# Altium footprint library JEDEC_G.PcbLib: 194 footprints (part 3 of 13)
Each footprint in its own frame and in the unit in brackets; x right, y up, seen from the top. Pads: shape width x height; smd on the part's side, far side on the other; paste and mask are expansions set on the pad; w line width, h text height; cw(c..) or ccw(c..) is an arc to the next point about the centre after c.
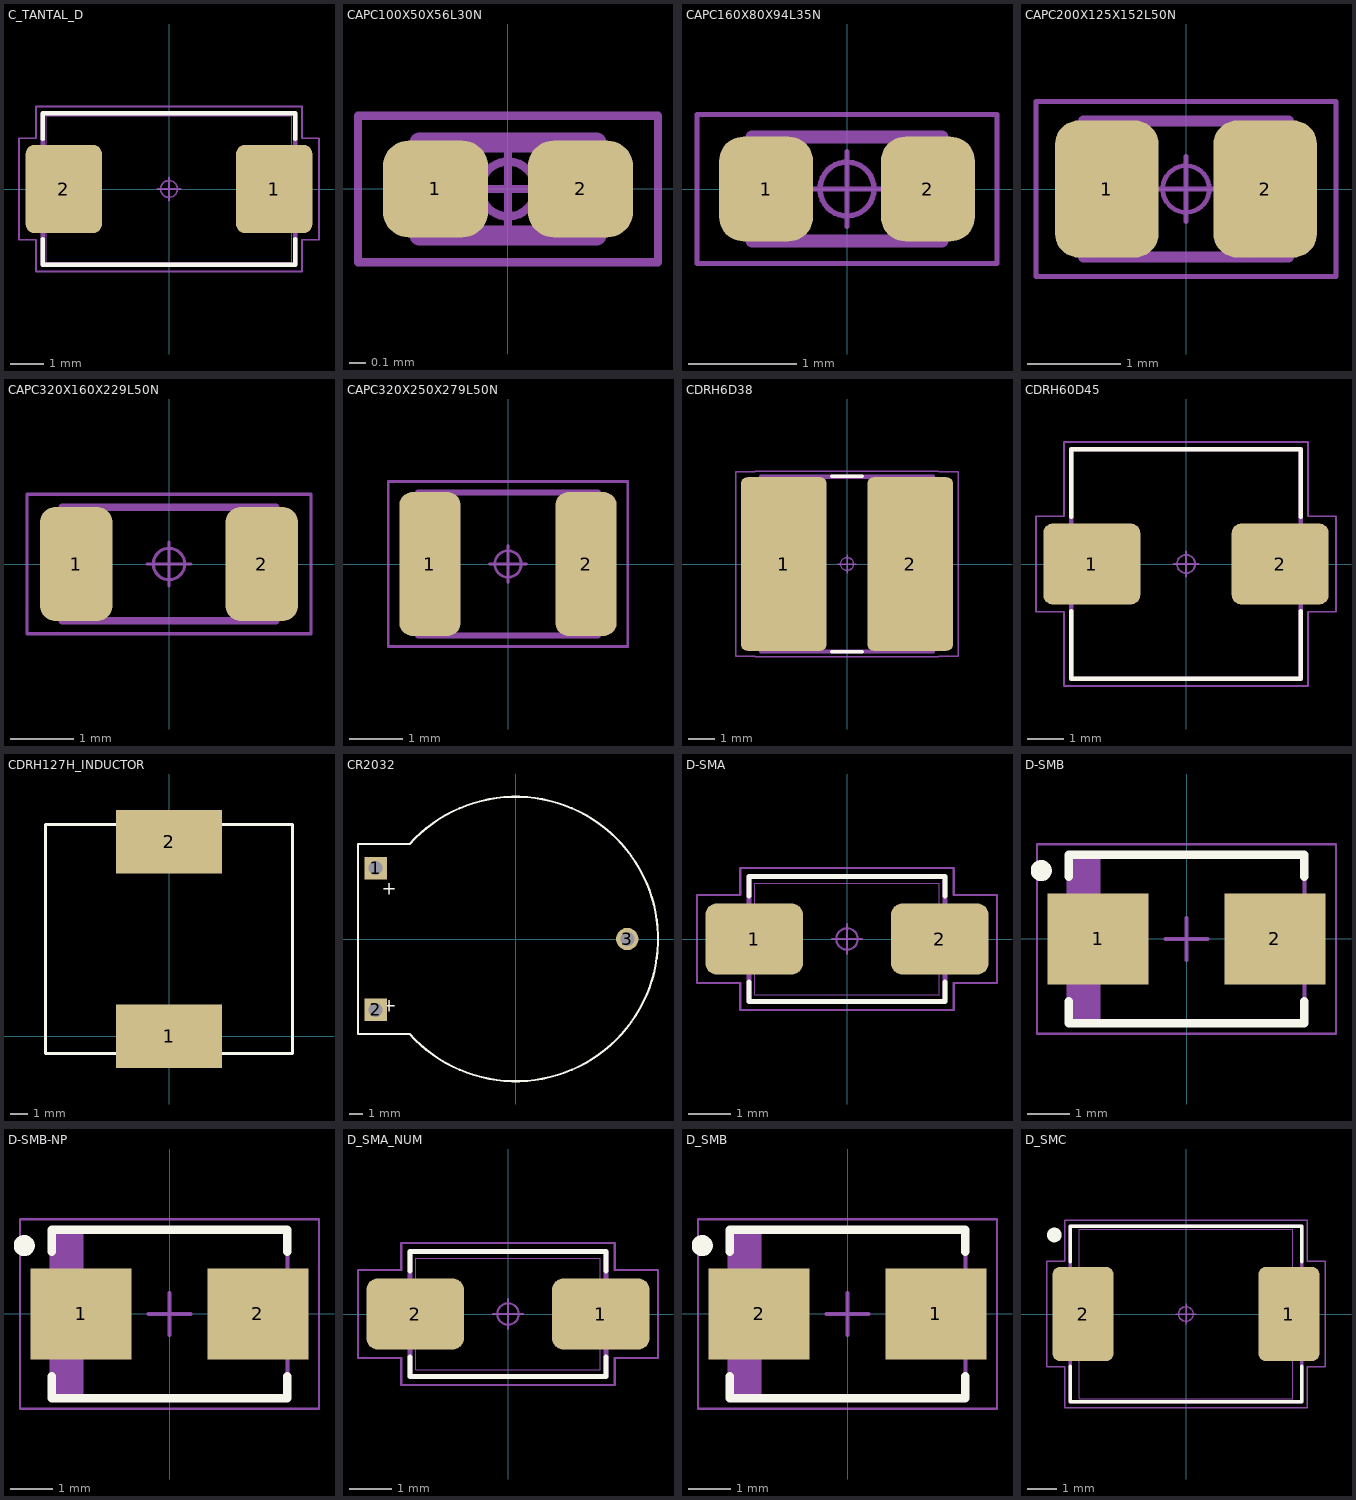
[diagram p2: the footprints below, top view; thin cyan lines are the x and y axes]

## C_TANTAL_D [mm] "Capacitor, Polarized, Molded Body; 7.30 mm L X 4.35 mm W X 3.10 mm H body"
height 3.1
pads (2):
  rrect22% 2.26x2.62 smd: 1(3.125,0) 2(-3.125,0)
Top Overlay:
  lines w0.12: -3.75,-1.49 -3.75,-2.25 3.75,-2.25 3.75,-1.49 ; -3.75,1.49 -3.75,2.25 3.75,2.25 3.75,1.49
Mechanical 11:
  lines w0.12: -3.75,-2.25 3.75,-2.25 3.75,2.25 -3.75,2.25 -3.75,-2.25
Mechanical 12:
  lines w0.025: -3.65,-2.175 3.65,-2.175 3.65,2.175 -3.65,2.175 -3.65,-2.175 ; -3.65,-1.2 -3.65,1.2 -2.3,1.2 -2.3,-1.2 -3.65,-1.2 ; 2.3,-1.2 3.65,-1.2 3.65,1.2 2.3,1.2 2.3,-1.2
Mechanical 15:
  circle w0.05: c0,0 r0.25
  lines w0.05: -0.35,0 0.35,0 ; 0,-0.35 0,0.35 ; -4.455,-1.51 -3.95,-1.51 -3.95,-2.45 3.95,-2.45 3.95,-1.51 4.455,-1.51 4.455,1.51 3.95,1.51 3.95,2.45 -3.95,2.45 -3.95,1.51 -4.455,1.51 -4.455,-1.51
Mechanical 16:
  text ".Designator" at 0,0 h1.2
3D body "C_TANTAL_D.STEP": height 3.1, standoff 0, extent -3.65,-2.175 3.65,2.175

## CAPC100X50X56L30N [mm] "Capacitor, Chip; 1.00 mm L X 0.50 mm W X 0.56 mm H body"
height 0.56
pads (2):
  rrect52% 0.63x0.58 smd paste-0.63 mask+0: 1(-0.435,0) 2(0.435,0)
Mechanical 13:
  lines w0.12: -0.53,-0.28 0.53,-0.28 0.53,0.28 -0.53,0.28 -0.53,-0.28
Mechanical 15:
  circle w0.05: c0,0 r0.165
  lines w0.05: -0.22,0 0.22,0 ; 0,-0.22 0,0.22 ; -0.9,-0.44 0.9,-0.44 0.9,0.44 -0.9,0.44 -0.9,-0.44
3D body "CAP-0402.stp": height 0.5, standoff 0, extent -0.5,-0.25 0.5,0.25

## CAPC160X80X94L35N [mm] "Capacitor, Chip; 1.60 mm L X 0.80 mm W X 0.94 mm H body"
height 0.94
pads (2):
  rrect51% 0.87x0.97 smd paste-0.97 mask+0: 1(-0.75,0) 2(0.75,0)
Mechanical 13:
  lines w0.12: -0.88,-0.48 0.88,-0.48 0.88,0.48 -0.88,0.48 -0.88,-0.48
Mechanical 15:
  circle w0.05: c0,0 r0.25
  lines w0.05: -0.345,0 0.345,0 ; 0,-0.345 0,0.345 ; -1.39,-0.69 1.39,-0.69 1.39,0.69 -1.39,0.69 -1.39,-0.69
3D body "CAP-0603.stp": height 0.8, standoff 0, extent -0.8,-0.4 0.8,0.4

## CAPC200X125X152L50N [mm] "Capacitor, Chip; 2.00 mm L X 1.25 mm W X 1.52 mm H body"
height 1.52
pads (2):
  rrect45% 1.11x1.47 smd paste-1.47 mask+0: 1(-0.85,0) 2(0.85,0)
Mechanical 13:
  lines w0.12: -1.1,-0.73 -1.1,0.73 1.1,0.73 1.1,-0.73 -1.1,-0.73
Mechanical 15:
  circle w0.05: c0,0 r0.25
  lines w0.05: -0.35,0 0.35,0 ; 0,-0.35 0,0.35 ; -1.61,-0.94 -1.61,0.94 1.61,0.94 1.61,-0.94 -1.61,-0.94
3D body "CAP-0805.stp": height 1.25, standoff 0, extent -1,-0.625 1,0.625

## CAPC320X160X229L50N [mm] "Capacitor, Chip; 3.20 mm L X 1.60 mm W X 2.29 mm H body"
height 2.29
pads (2):
  rrect43% 1.16x1.82 smd paste-1.82 mask+0: 1(-1.475,0) 2(1.475,0)
Mechanical 13:
  lines w0.12: -1.7,-0.9 1.7,-0.9 1.7,0.9 -1.7,0.9 -1.7,-0.9
Mechanical 15:
  circle w0.05: c0,0 r0.25
  lines w0.05: -0.35,0 0.35,0 ; 0,-0.35 0,0.35 ; -2.26,-1.11 2.26,-1.11 2.26,1.11 -2.26,1.11 -2.26,-1.11
3D body "CAP-1206.stp": height 1.6, standoff 0, extent -1.6,-0.8 1.6,0.8

## CAPC320X250X279L50N [mm] "Capacitor, Chip; 3.20 mm L X 2.50 mm W X 2.79 mm H body"
height 2.79
pads (2):
  rrect43% 1.16x2.72 smd paste-2.72 mask+0: 1(-1.475,0) 2(1.475,0)
Mechanical 13:
  lines w0.12: -1.7,-1.35 1.7,-1.35 1.7,1.35 -1.7,1.35 -1.7,-1.35
Mechanical 15:
  circle w0.05: c0,0 r0.25
  lines w0.05: -0.35,0 0.35,0 ; 0,-0.35 0,0.35 ; -2.26,-1.56 2.26,-1.56 2.26,1.56 -2.26,1.56 -2.26,-1.56
3D body "CAP-1210.stp": height 2.5, standoff 0, extent -1.6,-1.25 1.6,1.25

## CDRH6D38 [mm] "Inductor, Molded Body; 6.50 mm L X 6.55 mm W X 4.00 mm H body"
height 4
pads (2):
  rrect15% 3.28x6.63 smd: 1(-2.415,0) 2(2.415,0)
Top Overlay:
  lines w0.12: -0.595,-3.35 0.595,-3.35 ; -0.595,3.35 0.595,3.35
Mechanical 11:
  lines w0.12: -3.3,-3.35 3.3,-3.35 3.3,3.35 -3.3,3.35 -3.3,-3.35
Mechanical 12:
  lines w0.025: -3.35,-3.25 -3.35,3.25 -1.1,3.25 -1.1,-3.25 -3.35,-3.25 ; -3.25,-3.275 3.25,-3.275 3.25,3.275 -3.25,3.275 -3.25,-3.275 ; 1.1,-3.25 3.35,-3.25 3.35,3.25 1.1,3.25 1.1,-3.25
Mechanical 15:
  circle w0.05: c0,0 r0.25
  lines w0.05: -0.35,0 0.35,0 ; 0,-0.35 0,0.35 ; -4.255,-3.515 -3.5,-3.515 -3.5,-3.55 3.5,-3.55 3.5,-3.515 4.255,-3.515 4.255,3.515 3.5,3.515 3.5,3.55 -3.5,3.55 -3.5,3.515 -4.255,3.515 -4.255,-3.515
Mechanical 16:
  text ".Designator" at 0,0 h1.2
3D body "CDRH6D38.STEP": height 4, standoff 0, extent -3.35,-3.275 3.35,3.275

## CDRH60D45 [mm] "Inductor, Molded Body; 6.20 mm L X 6.20 mm W X 4.80 mm H body"
height 4.8
pads (2):
  rrect23% 2.66x2.22 smd: 1(-2.585,0) 2(2.585,0)
Top Overlay:
  lines w0.12: -3.15,-1.29 -3.15,-3.15 3.15,-3.15 3.15,-1.29 ; -3.15,1.29 -3.15,3.15 3.15,3.15 3.15,1.29
Mechanical 11:
  lines w0.12: -3.15,-3.15 -3.15,3.15 3.15,3.15 3.15,-3.15 -3.15,-3.15
Mechanical 12:
  lines w0.025: -3.25,-1 -1.55,-1 -1.55,1 -3.25,1 -3.25,-1 ; -3.1,-3.1 -3.1,3.1 3.1,3.1 3.1,-3.1 -3.1,-3.1 ; 1.55,-1 1.55,1 3.25,1 3.25,-1 1.55,-1
Mechanical 15:
  circle w0.05: c0,0 r0.25
  lines w0.05: -0.35,0 0.35,0 ; 0,-0.35 0,0.35 ; -4.115,-1.31 -4.115,1.31 -3.35,1.31 -3.35,3.35 3.35,3.35 3.35,1.31 4.115,1.31 4.115,-1.31 3.35,-1.31 3.35,-3.35 -3.35,-3.35 -3.35,-1.31 -4.115,-1.31
Mechanical 16:
  text ".Designator" at 0,0 h1.2
3D body "CDRH60D45.STEP": height 4.8, standoff 0, extent -3.25,-3.1 3.25,3.1

## CDRH127H_INDUCTOR [mm]
pads (2):
  rect 6x3.6 smd: 1(0,0) 2(0,11)
Top Overlay:
  lines w0.17: -3,-1 -7,-1 -7,12 -4,12 -3,12 ; 3,-1 7,-1 7,12 3,12
3D body "SUMIDA-CDRH127.step": height 7.5, standoff 0.05, extent -6,-0.671 6,11.671

## CR2032 [mm]
pads (3):
  rect 1.6x1.6 hole 1: 1(-10.033,5.08) 2(-10.033,-5.08)
  round 1.6 hole 1: 3(8,0)
Top Overlay:
  lines w0.152: -7.6,-6.8 -11.3,-6.8 -11.3,6.8 -7.6,6.8 ; -7.592,-6.812 ccw(c0,0) -7.592,6.812
  text "+" at -9.591,-5.229 h0.95
  text "+" at -9.591,3.171 h0.95
3D body "cr2032 pcb, lithium battery-1.step": height 7.25, standoff -3.97, extent -10.249,-10 10,10

## D-SMA [mm] "Diode, Molded Body; 4.315 mm L X 2.605 mm W X 2.41 mm H body"
height 2.41
pads (2):
  rrect30% 2.27x1.65 smd: 1(-2.165,0) 2(2.165,0)
Top Overlay:
  lines w0.12: -2.29,-1.005 -2.29,-1.46 2.29,-1.46 2.29,-1.005 ; -2.29,1.005 -2.29,1.46 2.29,1.46 2.29,1.005
Mechanical 11:
  lines w0.12: -2.29,-1.46 -2.29,1.46 2.29,1.46 2.29,-1.46 -2.29,-1.46
Mechanical 12:
  lines w0.025: -2.605,-0.725 -1.465,-0.725 -1.465,0.725 -2.605,0.725 -2.605,-0.725 ; -2.157,-1.302 -2.157,1.302 2.157,1.302 2.157,-1.302 -2.157,-1.302 ; 1.465,-0.725 1.465,0.725 2.605,0.725 2.605,-0.725 1.465,-0.725
Mechanical 15:
  circle w0.05: c0,0 r0.25
  lines w0.05: -0.35,0 0.35,0 ; 0,-0.35 0,0.35 ; -3.5,-1.025 -3.5,1.025 -2.49,1.025 -2.49,1.66 2.49,1.66 2.49,1.025 3.5,1.025 3.5,-1.025 2.49,-1.025 2.49,-1.66 -2.49,-1.66 -2.49,-1.025 -3.5,-1.025
3D body "DIOM521X260X241L114X145.STEP": height 2.41, standoff 0, extent -2.605,-1.302 2.605,1.302

## D-SMB [mm] "Molded Diode, 2-Leads, Body 5,35x3,63mm, IPC Medium Density"
height 2.65
pads (2):
  rect 2.4x2.15 smd: 1(-2.1,0) 2(2.1,0)
Top Overlay:
  circle w0.25: c-3.45,1.625 r0.125
  lines w0.2: -2.8,-1.475 -2.8,-2 2.8,-2 2.8,-1.475 ; -2.8,1.475 -2.8,2 2.8,2 2.8,1.475
Mechanical 13:
  rectangle: -2.8,-1.975 -2.047,1.975
  lines w0.1: -2.8,-1.975 -2.8,1.975 2.8,1.975 2.8,-1.975 -2.8,-1.975
Mechanical 15:
  lines w0.05: -3.55,-2.25 -3.55,2.25 3.55,2.25 3.55,-2.25 -3.55,-2.25
  lines w0.1: -0.5,0 0.5,0 ; 0,-0.5 0,0.5
3D body "D_SMB.step": height 2.15, standoff 0, extent -2.65,-1.775 2.65,1.775

## D-SMB-NP [mm] "Molded Diode, 2-Leads, Body 5,35x3,63mm, IPC Medium Density"
height 2.65
pads (2):
  rect 2.4x2.15 smd: 1(-2.1,0) 2(2.1,0)
Top Overlay:
  circle w0.25: c-3.45,1.625 r0.125
  lines w0.2: -2.8,-1.475 -2.8,-2 2.8,-2 2.8,-1.475 ; -2.8,1.475 -2.8,2 2.8,2 2.8,1.475
Mechanical 13:
  rectangle: -2.8,-1.975 -2.047,1.975
  lines w0.1: -2.8,-1.975 -2.8,1.975 2.8,1.975 2.8,-1.975 -2.8,-1.975
Mechanical 15:
  lines w0.05: -3.55,-2.25 -3.55,2.25 3.55,2.25 3.55,-2.25 -3.55,-2.25
  lines w0.1: -0.5,0 0.5,0 ; 0,-0.5 0,0.5
3D body "DIOM5336X26N.step": height 2.65, standoff 0, extent -3.02,-1.975 3.02,1.975

## D_SMA_NUM [mm]
pads (2):
  rrect30% 2.27x1.65 smd: 1(2.165,0) 2(-2.165,0)
Top Overlay:
  lines w0.12: -2.29,-1.005 -2.29,-1.46 2.29,-1.46 2.29,-1.005 ; -2.29,1.005 -2.29,1.46 2.29,1.46 2.29,1.005
Mechanical 11:
  lines w0.12: -2.29,-1.46 2.29,-1.46 2.29,1.46 -2.29,1.46 -2.29,-1.46
Mechanical 12:
  lines w0.025: -2.605,-0.725 -2.605,0.725 -1.465,0.725 -1.465,-0.725 -2.605,-0.725 ; -2.157,-1.302 2.157,-1.302 2.157,1.302 -2.157,1.302 -2.157,-1.302 ; 1.465,-0.725 2.605,-0.725 2.605,0.725 1.465,0.725 1.465,-0.725
Mechanical 15:
  circle w0.05: c0,0 r0.25
  lines w0.05: -0.35,0 0.35,0 ; 0,-0.35 0,0.35 ; -3.5,-1.025 -2.49,-1.025 -2.49,-1.66 2.49,-1.66 2.49,-1.025 3.5,-1.025 3.5,1.025 2.49,1.025 2.49,1.66 -2.49,1.66 -2.49,1.025 -3.5,1.025 -3.5,-1.025
3D body "DIOM521X260X241L114X145.STEP": height 2.41, standoff 0, extent -2.605,-1.302 2.605,1.302

## D_SMB [mm] "Molded Diode, 2-Leads, Body 5,35x3,63mm, IPC Medium Density"
height 2.65
pads (2):
  rect 2.4x2.15 smd: 1(2.1,0) 2(-2.1,0)
Top Overlay:
  circle w0.25: c-3.45,1.625 r0.125
  lines w0.2: -2.8,-1.475 -2.8,-2 2.8,-2 2.8,-1.475 ; -2.8,1.475 -2.8,2 2.8,2 2.8,1.475
Mechanical 13:
  rectangle: -2.8,-1.975 -2.047,1.975
  lines w0.1: -2.8,-1.975 2.8,-1.975 2.8,1.975 -2.8,1.975 -2.8,-1.975
Mechanical 15:
  lines w0.05: -3.55,-2.25 3.55,-2.25 3.55,2.25 -3.55,2.25 -3.55,-2.25
  lines w0.1: -0.5,0 0.5,0 ; 0,-0.5 0,0.5
3D body "D_SMB.step": height 2.15, standoff 0, extent -2.65,-1.775 2.65,1.775

## D_SMC [mm] "Diode, Molded Body; 7.30 mm L X 5.80 mm W X 2.50 mm H body"
height 2.5
pads (2):
  rrect24% 2.09x3.22 smd: 1(3.515,0) 2(-3.515,0)
Top Overlay:
  circle w0.25: c-4.5,2.7 r0.125
  lines w0.12: -3.95,-1.79 -3.95,-3 3.95,-3 3.95,-1.79 ; -3.95,1.79 -3.95,3 3.95,3 3.95,1.79
Mechanical 11:
  lines w0.12: -3.95,-3 3.95,-3 3.95,3 -3.95,3 -3.95,-3
Mechanical 12:
  lines w0.025: -3.95,-1.5 -3.95,1.5 -2.75,1.5 -2.75,-1.5 -3.95,-1.5 ; -3.65,-2.9 3.65,-2.9 3.65,2.9 -3.65,2.9 -3.65,-2.9 ; 2.75,-1.5 3.95,-1.5 3.95,1.5 2.75,1.5 2.75,-1.5
Mechanical 15:
  circle w0.05: c0,0 r0.25
  lines w0.05: -0.35,0 0.35,0 ; 0,-0.35 0,0.35 ; -4.76,-1.81 -4.15,-1.81 -4.15,-3.2 4.15,-3.2 4.15,-1.81 4.76,-1.81 4.76,1.81 4.15,1.81 4.15,3.2 -4.15,3.2 -4.15,1.81 -4.76,1.81 -4.76,-1.81
Mechanical 16:
  text ".Designator" at 0,0 h1.2
3D body "D_SMC.step": height 2.31, standoff 0, extent -4,-2.95 4,2.95